# Altium footprint library PCB_LU_V2.PcbLib: 47 footprints (part 1 of 3)
Each footprint in its own frame and in the unit in brackets; x right, y up, seen from the top. Pads: shape width x height; smd on the part's side, far side on the other; paste and mask are expansions set on the pad; w line width, h text height; cw(c..) or ccw(c..) is an arc to the next point about the centre after c.
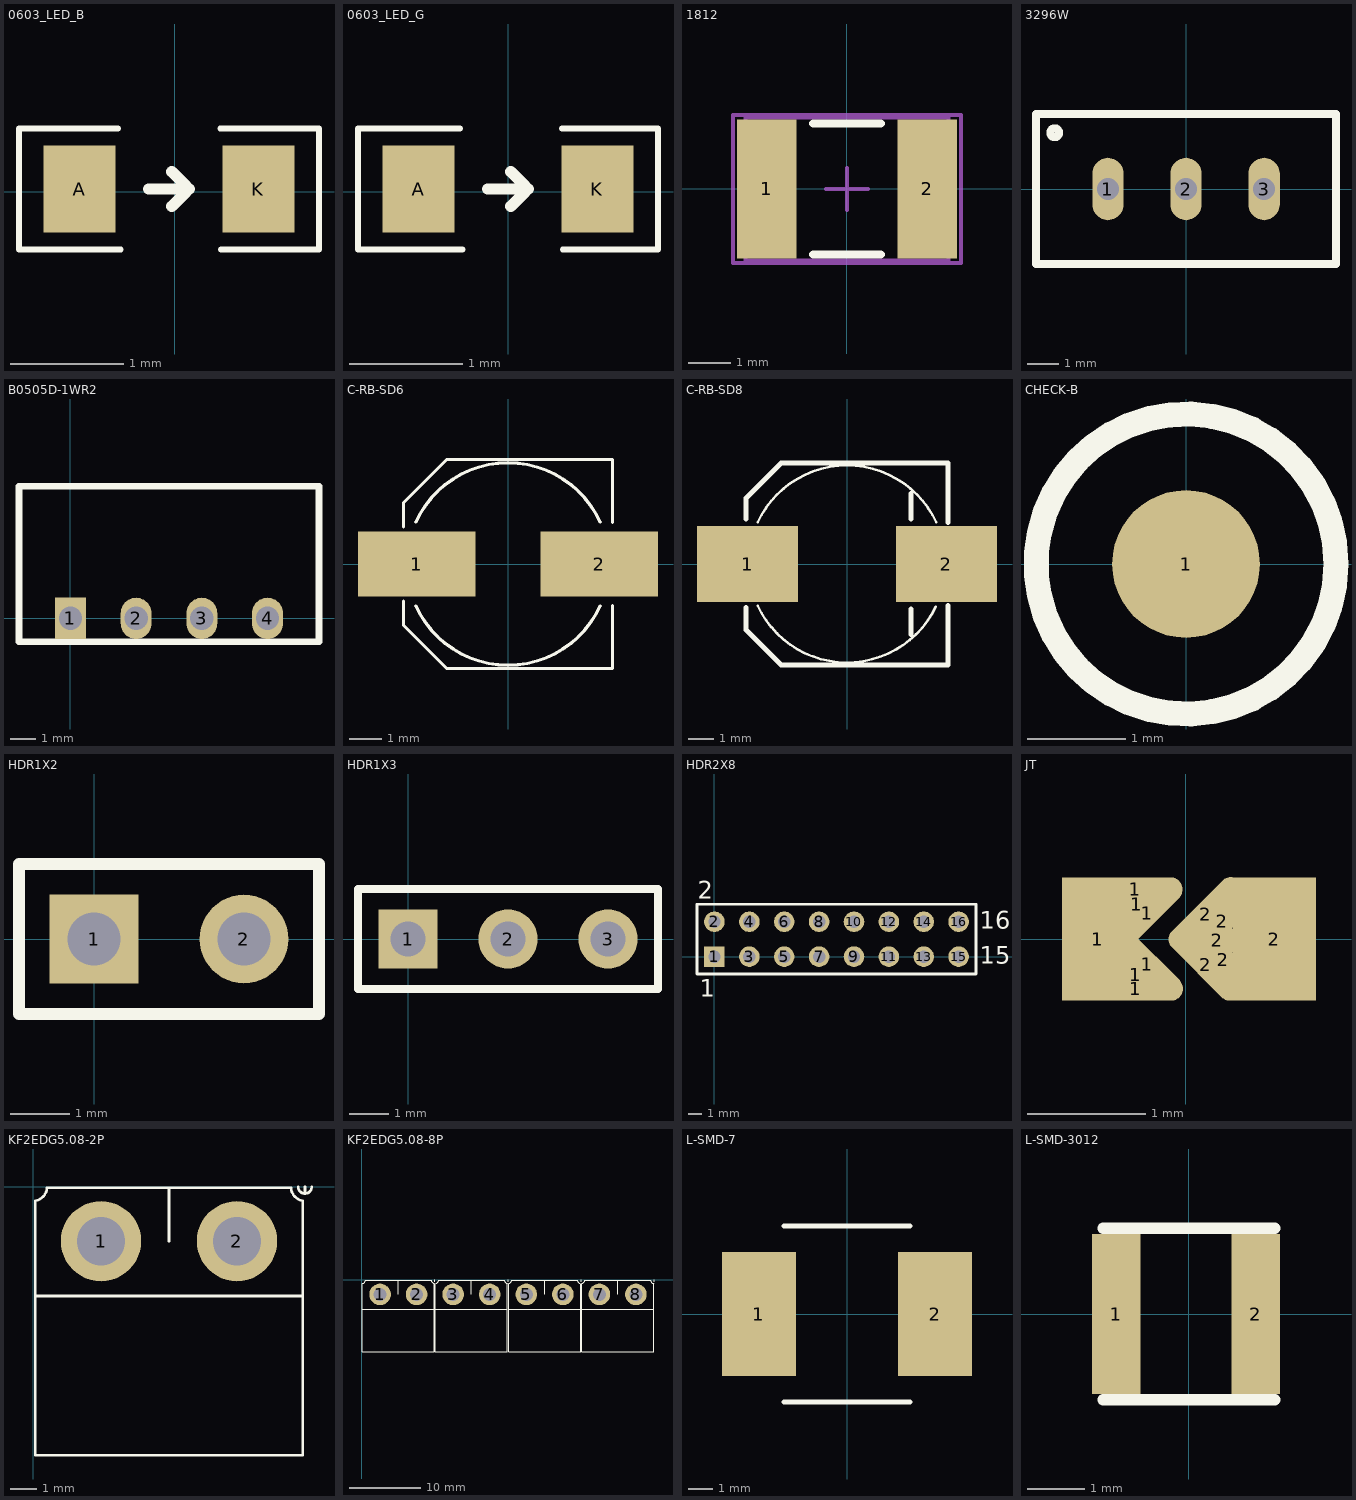
[diagram p0: the footprints below, top view; thin cyan lines are the x and y axes]

## 0603_LED_B [mil]
pads (2):
  rect 25x30 smd: A(-33,1) K(29,1)
Top Overlay:
  lines w2: -19.65,22 -54,22 -54,-20 -18.75,-20 ; 15.75,22 50,22 50,-20 16,-20
  lines w3.94: -9,1 5,1 ; -1,-5 4,0 ; -1,7 4,2
3D body "User Library-LED_0603_B.STEP": height 23.62, standoff -0.08, extent -34.49,-14.75 28.5,16.75

## 0603_LED_G [mil]
pads (2):
  rect 25x30 smd: A(-31,1) K(31,1)
Top Overlay:
  lines w2: -16.65,22 -52,22 -52,-20 -15.75,-20 ; 18.75,22 52,22 52,-20 19,-20
  lines w3.94: -7,1 7,1 ; 1,-5 6,0 ; 1,7 6,2
3D body "User Library-LED_0603_G.STEP": height 23.62, standoff -0.08, extent -32.49,-14.74 30.5,16.76

## 1812 [mm] "Chip Capacitor, Body 4.5x3.2"
height 1.4
pads (2):
  rect 1.4x3.3 smd: 1(-1.9,0) 2(1.9,0)
Top Overlay:
  lines w0.2: -0.8,-1.55 0.8,-1.55 ; -0.8,1.55 0.8,1.55
Mechanical 13:
  lines w0.1: -2.4,-1.7 2.4,-1.7 2.4,1.7 -2.4,1.7 -2.4,-1.7
Mechanical 15:
  lines w0.1: -0.5,0 0.5,0 ; 0,-0.5 0,0.5 ; -2.7,-1.75 2.7,-1.75 2.7,1.75 -2.7,1.75 -2.7,-1.75
3D body: height 1.4, standoff 0, extent -2.4,-1.7 2.4,1.7

## 3296W [mm]
pads (3):
  oval 1x2 hole 0.7: 1(-2.5,0) 2(0,0) 3(2.5,0)
Top Overlay:
  circle w0.254: c-4.2,1.8 r0.141
  lines w0.254: -4.8,-2.4 4.8,-2.4 4.8,2.4 -4.8,2.4 -4.8,-2.4

## B0505D-1WR2 [mm]
height 1.5
pads (4):
  rect 1.2x1.6 hole 0.9: 1(0,0)
  oval 1.2x1.6 hole 0.9: 2(2.54,0) 3(5.08,0) 4(7.62,0)
Top Overlay:
  lines w0.254: -1.99,5.08 -1.99,-0.9 9.61,-0.9 9.61,5.1 -1.99,5.1

## C-RB-SD6 [mm] "贴?"
height 7
pads (2):
  rect 3.6x2 smd: 1(-2.794,0) 2(2.794,0)
Top Overlay:
  lines w0.1: -3.2,-1.143 -3.2,-1.88 -1.88,-3.2 3.2,-3.2 3.2,-1.27 ; -3.2,1.143 -3.2,1.88 -1.88,3.2 3.2,3.2 3.2,1.27 ; -2.822,-1.283 ccw(c0,0) 2.822,-1.283 ; -2.822,1.283 cw(c0,0) 2.822,1.283

## C-RB-SD8 [mm] "贴?"
height 10.2
pads (2):
  rect 4x3 smd: 1(-3.937,0) 2(3.937,0)
Top Overlay:
  lines w0.1: -3.539,-1.643 ccw(c0,0) 3.516,-1.693 ; -3.539,1.643 cw(c0,0) 3.539,1.643
  lines w0.2: -4,-1.714 -4,-2.604 -2.604,-4 4,-4 4,-1.651 ; -4,1.778 -4,2.604 -2.604,4 4,4 4,1.651 ; 2.54,-2.794 2.54,-1.778 ; 2.54,1.778 2.54,2.794
3D body: height 0.6, standoff 0, extent -3.937,-3.937 3.937,3.937
3D body: height 8, standoff 0, extent -3.953,-3.992 4.015,3.992

## CHECK-B [mm]
height 1.45
pads (1):
  round 1.5 smd: 1(0,0)
Top Overlay:
  circle w0.254: c0,0 r1.524

## HDR1X2 [mm] "Connector; Header; 2 Posi"
pads (2):
  rect 1.5x1.5 hole 0.9: 1(0,0)
  round 1.5 hole 0.9: 2(2.54,0)
Top Overlay:
  lines w0.2: -1.27,-1.27 3.81,-1.27 3.81,1.27 -1.27,1.27 -1.27,-1.27

## HDR1X3 [mm] "Connector; Header; 3 Posi"
pads (3):
  rect 1.5x1.5 hole 0.9: 1(0,0)
  round 1.5 hole 0.9: 2(2.54,0) 3(5.08,0)
Top Overlay:
  lines w0.2: -1.27,-1.27 6.35,-1.27 6.35,1.27 -1.27,1.27 -1.27,-1.27

## HDR2X8 [mm] "Connector; Header; 8x2 Posi"
pads (16):
  rect 1.5x1.5 hole 0.9: 1(0,0)
  round 1.5 hole 0.9: 2(0,2.54) 3(2.54,0) 4(2.54,2.54) 5(5.08,0) 6(5.08,2.54) 7(7.62,0) 8(7.62,2.54) 9(10.16,0) 10(10.16,2.54) 11(12.7,0) 12(12.7,2.54) 13(15.24,0) 14(15.24,2.54) 15(17.78,0) 16(17.78,2.54)
Top Overlay:
  lines w0.2: -1.27,-1.27 -1.27,3.81 19.05,3.81 19.05,-1.27 -1.27,-1.27
  text "2" at -1.21,4.217 h1.27
  text "1" at -1.077,-2.92 h1.27
  text "15" at 19.304,-0.508 h1.27
  text "16" at 19.304,2.032 h1.27

## JT [mm]
pads (13):
  rect 0.6x1.04 smd: 1(-0.745,0)
  oval 0.8x0.2 smd: 1(-0.428,0.42) 1(-0.425,-0.42)
  oval 0.2x0.4 smd rot 45: 1(-0.425,-0.3) 2(0.315,-0.175)
  oval 0.2x0.4 smd rot 135: 1(-0.415,0.295) 2(0.305,0.15)
  oval 0.2x0.75 smd rot 45: 1(-0.327,-0.215)
  oval 0.2x0.75 smd rot 135: 1(-0.327,0.217)
  oval 0.2x0.78 smd rot 45: 2(0.165,-0.215)
  oval 0.2x0.8 smd rot 135: 2(0.165,0.21)
  oval 0.5x0.2 smd: 2(0.265,-0.01)
  rect 0.7x1.04 smd: 2(0.745,0)
Top Solder:
  rectangle: -1.15,-0.625 1.2,0.625

## KF2EDG5.08-2P [mm]
pads (2):
  round 3 hole 1.8: 1(2.54,-2.032) 2(7.62,-2.032)
Top Overlay:
  lines w0.1: 0.08,-4.082 10.08,-4.082 ; 0.08,-0.518 0.08,-10.032 10.08,-10.032 10.08,-0.518 ; 0.083,-0.518 ccw(c0,0) 0.524,-0.032 9.635,-0.032 ccw(c10.16,0) 10.077,-0.518 ; 5.08,-2.032 5.08,-0.032 ; 9.906,0 ccw(c10.16,0) 10.414,0 ; 10.16,-0.254 10.16,0

## KF2EDG5.08-8P [mm]
pads (8):
  round 3 hole 1.8: 1(2.54,-2.032) 2(7.62,-2.032) 3(12.7,-2.032) 4(17.78,-2.032) 5(22.86,-2.032) 6(27.94,-2.032) 7(33.02,-2.032) 8(38.1,-2.032)
Top Overlay:
  lines w0.1: 0.08,-4.082 10.08,-4.082 ; 0.08,-0.518 0.08,-10.032 10.08,-10.032 10.08,-0.518 ; 0.083,-0.518 ccw(c0,0) 0.524,-0.032 9.635,-0.032 ccw(c10.16,0) 10.077,-0.518 ; 5.08,-2.032 5.08,-0.032 ; 10.16,-0.254 10.16,0 ; 10.24,-4.082 20.24,-4.082 ; 10.24,-0.518 10.24,-10.032 20.24,-10.032 20.24,-0.518 ; 10.243,-0.518 ccw(c10.16,0) 10.684,-0.032 19.795,-0.032 ccw(c20.32,0) 20.237,-0.518 ; 15.24,-2.032 15.24,-0.032 ; 20.32,-0.254 20.32,0 ; 20.4,-4.082 30.4,-4.082 ; 20.4,-0.518 20.4,-10.032 30.4,-10.032 30.4,-0.518 ; 20.403,-0.518 ccw(c20.32,0) 20.844,-0.032 29.955,-0.032 ccw(c30.48,0) 30.397,-0.518 ; 25.4,-2.032 25.4,-0.032 ; 30.48,-0.254 30.48,0 ; 30.56,-4.082 40.56,-4.082 ; 30.56,-0.518 30.56,-10.032 40.56,-10.032 40.56,-0.518 ; 30.563,-0.518 ccw(c30.48,0) 31.004,-0.032 40.115,-0.032 ccw(c40.64,0) 40.557,-0.518 ; 35.56,-2.032 35.56,-0.032 ; 40.64,-0.254 40.64,0

## L-SMD-7 [mm]
pads (2):
  rect 3x5 smd: 1(-3.556,0) 2(3.556,0)
Top Overlay:
  lines w0.2: -2.54,-3.556 2.54,-3.556 ; -2.54,3.556 2.54,3.556
3D body: height 4, standoff 0, extent -3.556,-3.556 3.556,3.556

## L-SMD-3012 [mm]
pads (2):
  rect 0.85x2.8 smd: 1(-1.27,0) 2(1.168,0)
Top Overlay:
  lines w0.2: -1.5,-1.5 1.5,-1.5 ; -1.5,1.5 1.5,1.5
3D body: height 4, standoff 0, extent -1.803,-1.6 1.702,1.6